# Altium footprint library My Library.PcbLib: 872 footprints (part 51 of 55)
Each footprint in its own frame and in the unit in brackets; x right, y up, seen from the top. Pads: shape width x height; smd on the part's side, far side on the other; paste and mask are expansions set on the pad; w line width, h text height; cw(c..) or ccw(c..) is an arc to the next point about the centre after c.
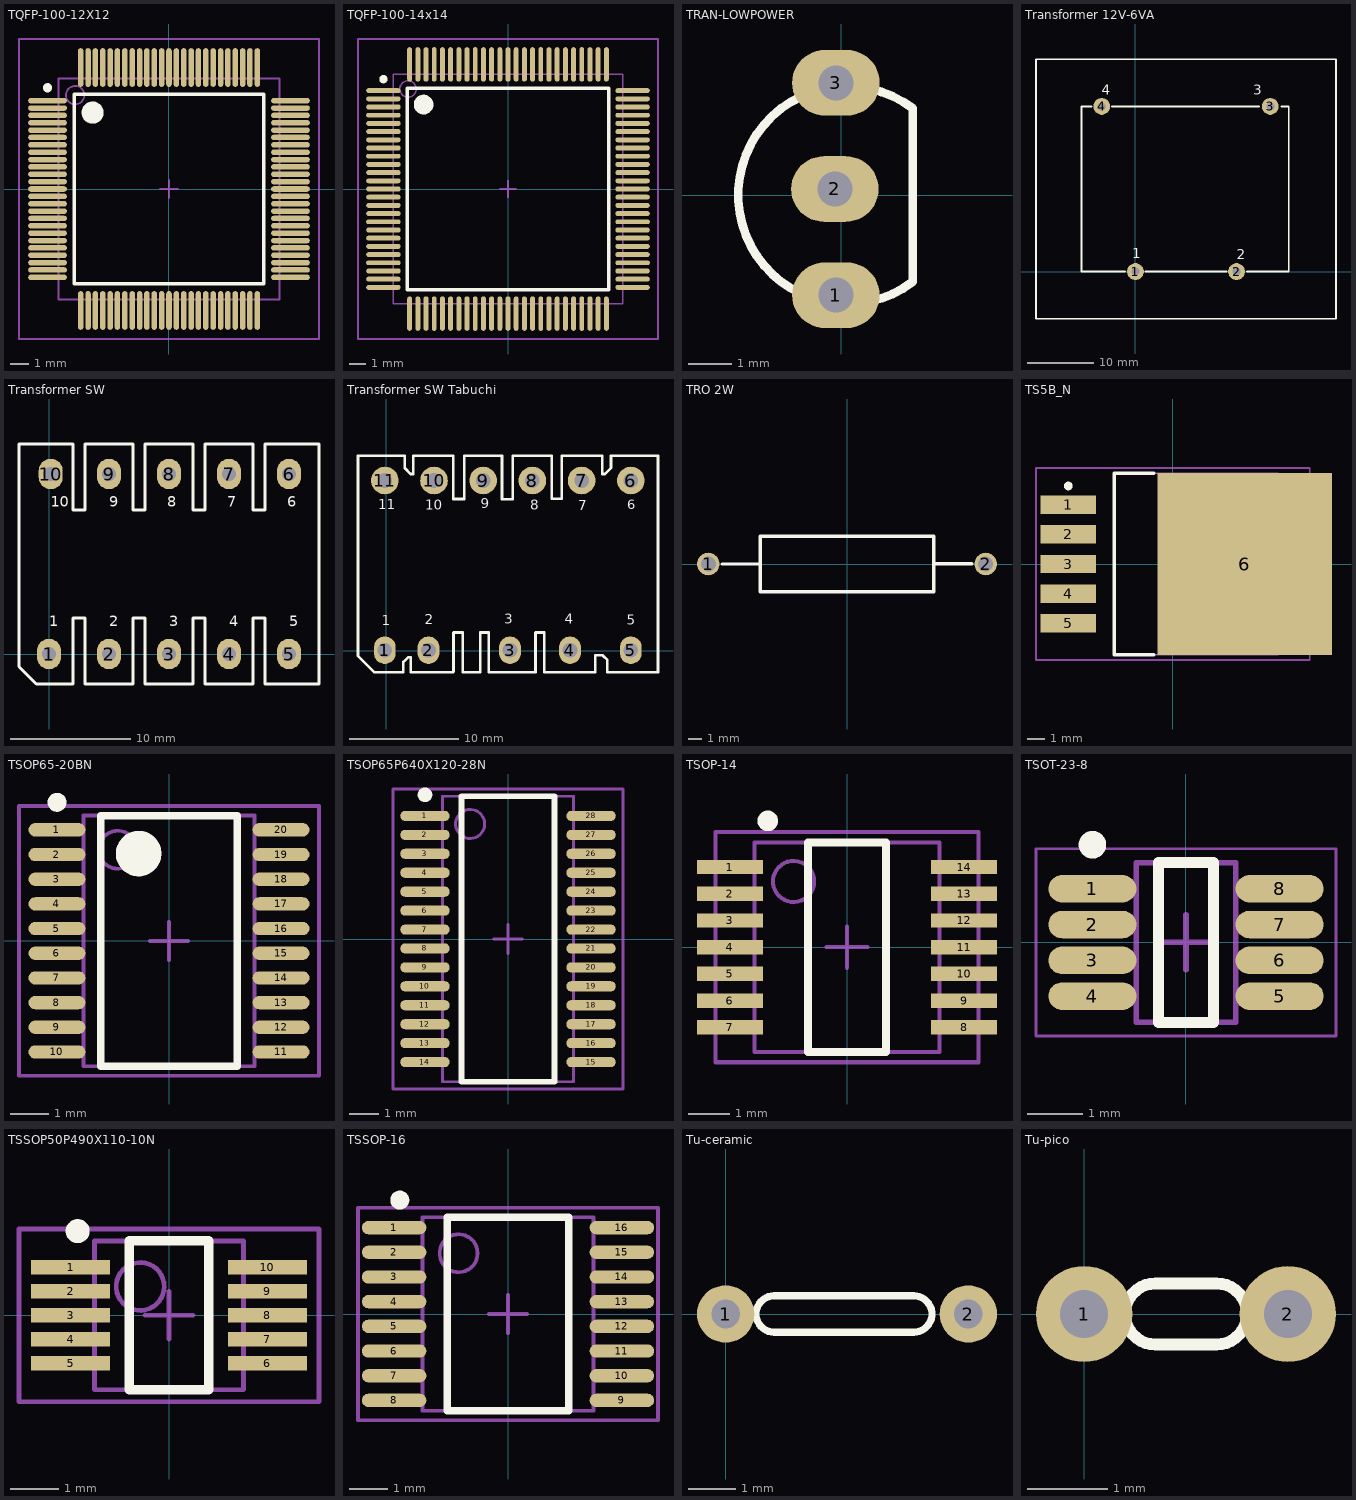
[diagram p50: the footprints below, top view; thin cyan lines are the x and y axes]

## TQFP-100-12X12 [mm] "Shrink QFP, 100-Leads, Body 12x12mm, Pitch 0.4mm, IPC High Density"
height 2.2
pads (100):
  oval 2.1x0.3 smd: 1(-6.6,4.8) 2(-6.6,4.4) 3(-6.6,4) 4(-6.6,3.6) 5(-6.6,3.2) 6(-6.6,2.8) 7(-6.6,2.4) 8(-6.6,2) 9(-6.6,1.6) 10(-6.6,1.2) 11(-6.6,0.8) 12(-6.6,0.4) 13(-6.6,0) 14(-6.6,-0.4) 15(-6.6,-0.8) 16(-6.6,-1.2) 17(-6.6,-1.6) 18(-6.6,-2) 19(-6.6,-2.4) 20(-6.6,-2.8) 21(-6.6,-3.2) 22(-6.6,-3.6) 23(-6.6,-4) 24(-6.6,-4.4) 25(-6.6,-4.8) 51(6.6,-4.8) 52(6.6,-4.4) 53(6.6,-4) 54(6.6,-3.6) 55(6.6,-3.2) 56(6.6,-2.8) 57(6.6,-2.4) 58(6.6,-2) 59(6.6,-1.6) 60(6.6,-1.2) 61(6.6,-0.8) 62(6.6,-0.4) 63(6.6,0) 64(6.6,0.4) 65(6.6,0.8) 66(6.6,1.2) 67(6.6,1.6) 68(6.6,2) 69(6.6,2.4) 70(6.6,2.8) 71(6.6,3.2) 72(6.6,3.6) 73(6.6,4) 74(6.6,4.4) 75(6.6,4.8)
  oval 0.3x2.1 smd: 26(-4.8,-6.6) 27(-4.4,-6.6) 28(-4,-6.6) 29(-3.6,-6.6) 30(-3.2,-6.6) 31(-2.8,-6.6) 32(-2.4,-6.6) 33(-2,-6.6) 34(-1.6,-6.6) 35(-1.2,-6.6) 36(-0.8,-6.6) 37(-0.4,-6.6) 38(0,-6.6) 39(0.4,-6.6) 40(0.8,-6.6) 41(1.2,-6.6) 42(1.6,-6.6) 43(2,-6.6) 44(2.4,-6.6) 45(2.8,-6.6) 46(3.2,-6.6) 47(3.6,-6.6) 48(4,-6.6) 49(4.4,-6.6) 50(4.8,-6.6) 76(4.8,6.6) 77(4.4,6.6) 78(4,6.6) 79(3.6,6.6) 80(3.2,6.6) 81(2.8,6.6) 82(2.4,6.6) 83(2,6.6) 84(1.6,6.6) 85(1.2,6.6) 86(0.8,6.6) 87(0.4,6.6) 88(0,6.6) 89(-0.4,6.6) 90(-0.8,6.6) 91(-1.2,6.6) 92(-1.6,6.6) 93(-2,6.6) 94(-2.4,6.6) 95(-2.8,6.6) 96(-3.2,6.6) 97(-3.6,6.6) 98(-4,6.6) 99(-4.4,6.6) 100(-4.8,6.6)
Top Overlay:
  circle w0.6: c-4.15,4.15 r0.3
  circle w0.25: c-6.6,5.5 r0.125
  lines w0.2: -5.15,-5.15 5.15,-5.15 5.15,5.15 -5.15,5.15 -5.15,-5.15
Mechanical 13:
  circle w0.1: c-5.1,5.1 r0.5
  lines w0.1: -6,-6 6,-6 6,6 -6,6 -6,-6
Mechanical 15:
  lines w0.1: -0.5,0 0.5,0 ; 0,-0.5 0,0.5 ; -8.15,-8.15 8.15,-8.15 8.15,8.15 -8.15,8.15 -8.15,-8.15
3D body: height 2.2, standoff 0, extent -6,-6 6,6

## TQFP-100-14x14 [mm] "Thin QFP, 100-Leads, Body 14x14mm, Pitch 0.5mm, IPC Low Density"
height 1.6
pads (100):
  oval 2.1x0.3 smd: 1(-7.6,6) 2(-7.6,5.5) 3(-7.6,5) 4(-7.6,4.5) 5(-7.6,4) 6(-7.6,3.5) 7(-7.6,3) 8(-7.6,2.5) 9(-7.6,2) 10(-7.6,1.5) 11(-7.6,1) 12(-7.6,0.5) 13(-7.6,0) 14(-7.6,-0.5) 15(-7.6,-1) 16(-7.6,-1.5) 17(-7.6,-2) 18(-7.6,-2.5) 19(-7.6,-3) 20(-7.6,-3.5) 21(-7.6,-4) 22(-7.6,-4.5) 23(-7.6,-5) 24(-7.6,-5.5) 25(-7.6,-6) 51(7.6,-6) 52(7.6,-5.5) 53(7.6,-5) 54(7.6,-4.5) 55(7.6,-4) 56(7.6,-3.5) 57(7.6,-3) 58(7.6,-2.5) 59(7.6,-2) 60(7.6,-1.5) 61(7.6,-1) 62(7.6,-0.5) 63(7.6,0) 64(7.6,0.5) 65(7.6,1) 66(7.6,1.5) 67(7.6,2) 68(7.6,2.5) 69(7.6,3) 70(7.6,3.5) 71(7.6,4) 72(7.6,4.5) 73(7.6,5) 74(7.6,5.5) 75(7.6,6)
  oval 0.3x2.1 smd: 26(-6,-7.6) 27(-5.5,-7.6) 28(-5,-7.6) 29(-4.5,-7.6) 30(-4,-7.6) 31(-3.5,-7.6) 32(-3,-7.6) 33(-2.5,-7.6) 34(-2,-7.6) 35(-1.5,-7.6) 36(-1,-7.6) 37(-0.5,-7.6) 38(0,-7.6) 39(0.5,-7.6) 40(1,-7.6) 41(1.5,-7.6) 42(2,-7.6) 43(2.5,-7.6) 44(3,-7.6) 45(3.5,-7.6) 46(4,-7.6) 47(4.5,-7.6) 48(5,-7.6) 49(5.5,-7.6) 50(6,-7.6) 76(6,7.6) 77(5.5,7.6) 78(5,7.6) 79(4.5,7.6) 80(4,7.6) 81(3.5,7.6) 82(3,7.6) 83(2.5,7.6) 84(2,7.6) 85(1.5,7.6) 86(1,7.6) 87(0.5,7.6) 88(0,7.6) 89(-0.5,7.6) 90(-1,7.6) 91(-1.5,7.6) 92(-2,7.6) 93(-2.5,7.6) 94(-3,7.6) 95(-3.5,7.6) 96(-4,7.6) 97(-4.5,7.6) 98(-5,7.6) 99(-5.5,7.6) 100(-6,7.6)
Top Overlay:
  circle w0.25: c-7.6,6.7 r0.125
  circle w0.6: c-5.15,5.15 r0.3
  lines w0.2: -6.15,-6.15 -6.15,6.15 6.15,6.15 6.15,-6.15 -6.15,-6.15
Mechanical 13:
  circle w0.1: c-6.1,6.1 r0.5
  lines w0.1: -7,-7 -7,7 7,7 7,-7 -7,-7
Mechanical 15:
  lines w0.1: -0.5,0 0.5,0 ; 0,-0.5 0,0.5 ; -9.15,-9.15 -9.15,9.15 9.15,9.15 9.15,-9.15 -9.15,-9.15
3D body: height 1.6, standoff 0, extent -7,-7 7,7

## TRAN-LOWPOWER [mm] "TO, Flat Index; 3 In-Line, Axial Leads; Body Dia. 4.5mm; Leads 0.51 x 0.48 mm (max)"
height 6.86
pads (3):
  oval 2x1.5 hole 0.8: 1(-0.127,-2.286) 2(-0.151,0.139) 3(-0.127,2.564)
Top Overlay:
  lines w0.2: 1.627,-1.98 cw(c0.127,0) 1.627,1.98 1.627,-1.98
3D body "BJT.step": height 11, standoff -1, extent -2.476,-2.794 1.524,3.006

## Transformer 12V-6VA [mm] "Transformer; 4 Leads"
pads (4):
  round 2.54 hole 1.2: 1(0,0) 2(15.24,0) 3(20.32,24.892) 4(-5.08,24.892)
Top Overlay:
  lines w0.254: -6.604,24.892 -8.128,24.892 -8.128,24.638 -8.128,0.254 -8.128,0 -1.524,0 ; -3.556,24.892 18.669,24.892 ; 1.524,0 13.716,0 ; 16.764,0 23.114,0 23.114,0.254 23.114,24.638 23.114,24.892 21.971,24.892 ; -14.986,-7.112 -14.986,32.004 30.226,32.004 30.226,-7.112 -14.986,-7.112
  text "3" at 17.78,26.67 h1.5
  text "4" at -5.08,26.67 h1.5
  text "2" at 15.24,1.882 h1.5
  text "1" at -0.508,2.032 h1.5
3D body: height 31, standoff 20, extent -8.128,0 23.114,24.892
3D body: height 26, standoff 1, extent -14.986,-7.112 30.226,32.004
3D body: height 1, standoff -4, extent -5.576,24.393 -4.58,25.391
3D body: height 1, standoff -4, extent 19.824,24.393 20.82,25.391
3D body: height 1, standoff -4, extent 14.744,-0.499 15.74,0.499
3D body: height 1, standoff -4, extent -0.496,-0.499 0.5,0.499

## Transformer SW [mm] "Transformer; 4 Leads"
pads (10):
  oval 2x2.54 hole 1.2: 1(0,0) 2(5,0) 3(10,0) 4(15,0) 5(20,0) 6(20,15) 7(15,15) 8(10,15) 9(5,15) 10(0.142,15)
Top Overlay:
  lines w0.254: -2.5,-1.056 -2.5,17.5 2,17.5 2,12 3,12 3,17.5 7,17.5 7,12 8,12 8,17.5 12,17.5 12,12 13,12 13,17.5 17,17.5 17,12 18,12 18,17.5 22.5,17.5 22.5,-2.5 18,-2.5 18,3 17,3 17,-2.5 13,-2.5 13,3 12,3 12,-2.5 8,-2.5 8,3 7,3 7,-2.5 3,-2.5 3,3 2,3 2,-2.5 -1.056,-2.5 -2.5,-1.056
  text "10" at 0.142,12 h1.52
  text "9" at 5,12 h1.52
  text "8" at 9.873,12 h1.52
  text "7" at 14.873,12 h1.52
  text "6" at 19.873,12 h1.52
  text "5" at 20,2 h1.52
  text "4" at 15,2 h1.52
  text "3" at 10,2.032 h1.52
  text "2" at 5,2.032 h1.52
  text "1" at 0,2.032 h1.5
3D body: height 1, standoff -4, extent -0.496,-0.499 0.5,0.499

## Transformer SW Tabuchi [mil] "Transformer; 4 Leads"
pads (11):
  oval 78.74x100 hole 53.15: 1(-5,1) 2(153,1) 3(448,1) 4(665,1) 5(885,1)
  round 100 hole 53.15: 6(885,615) 7(707,615) 8(529,615) 9(351,615) 10(173,615) 11(-5,615)
Top Overlay:
  lines w10: 89,-79 243,-79 ; 89,-77 89,-24 80,-24 62,-42 62,-79 -43,-79 -102,-20 -102,705 67,705 67,660 88,639 98,639 98,705 243,705 243,548 282,548 282,705 419,705 419,547 458,547 458,705 599,705 599,549 635,549 635,705 782,705 782,639 792,639 813,660 813,705 983.43,705 983.43,-79 800,-79 800,-34 783,-17 756,-17 756,-79 572,-79 572,65 540,65 540,-79 371,-79 371,65 340,65 340,-79 277,-79 277,65 244,65 244,-68.98 244,-76 243,-77
  text "11" at -28,498 h60
  text "5" at 871,80 h60
  text "4" at 646,84 h60
  text "3" at 428,85 h60
  text "2" at 140,82 h60
  text "1" at -16,78 h60
  text "10" at 141,497 h60
  text "9" at 343,502 h60
  text "8" at 521,496 h60
  text "7" at 694,494 h60
  text "6" at 873,499 h59.06
3D body: height 748.03, standoff 236.22, extent 80.5,-80 800.5,700
3D body: height 39.37, standoff -157.48, extent 687.31,595.36 726.53,634.64
3D body: height 39.37, standoff -157.48, extent 509.31,595.36 548.53,634.64
3D body: height 39.37, standoff -157.48, extent 331.31,595.36 370.53,634.64
3D body: height 39.37, standoff -157.48, extent 153.31,595.36 192.53,634.64
3D body: height 39.37, standoff -157.48, extent -24.69,595.36 14.53,634.64
3D body: height 39.37, standoff -157.48, extent -24.69,-18.64 14.53,20.64
3D body: height 39.37, standoff -157.48, extent 133.31,-18.64 172.53,20.64
3D body: height 39.37, standoff -157.48, extent 428.31,-18.64 467.53,20.64
3D body: height 39.37, standoff -157.48, extent 645.31,-18.64 684.53,20.64
3D body: height -748.03, standoff -826.77, extent -103,-80 984,705
3D body: height 39.37, standoff -157.48, extent 865.31,-18.64 904.53,20.64
3D body: height 39.37, standoff -157.48, extent 865.31,595.36 904.53,634.64
3D body: height -39.37, standoff -196.85, extent -103,-80 984,705
3D body: height 830.71, standoff 39.37, extent -110,230 990,420

## TRO 2W [mil] "Tro 2W"
height 10
pads (2):
  round 65 hole 43.31: 1(-400,0) 2(400,0)
Top Overlay:
  lines w10: -360,0 -250,0 ; 251,1 250,0 250,-80 -250,-80 -250,80 250,80 250,1 360,1
3D body "User Library-Res80 2W SilCoat.STEP": height 217.48, standoff -68.74, extent -415.95,-108.28 415.94,108.26

## TS5B_N [mm]
pads (6):
  rect 3.2x1.05 smd: 1(-6,3.4) 2(-6,1.7) 3(-6,0) 4(-6,-1.7) 5(-6,-3.4)
  rect 10x10.45 smd: 6(4.131,0)
Top Overlay:
  circle w0.25: c-6,4.475 r0.125
  lines w0.2: -1.1,-5.2 -3.35,-5.2 -3.35,5.2 -1.1,5.2
Mechanical 13:
  lines w0.1: -3.35,-5.2 6.05,-5.2 6.05,5.2 -3.35,5.2 -3.35,-5.2
Mechanical 15:
  lines w0.1: -0.5,0 0.5,0 ; 0,-0.5 0,0.5 ; -7.85,-5.5 7.85,-5.5 7.85,5.5 -7.85,5.5 -7.85,-5.5
3D body: height 4.65, standoff 0, extent -3.35,-5.2 6.05,5.2
3D body: height 0.5, standoff 0, extent -6.566,2.832 -4.305,3.924
3D body: height 2, standoff 0, extent -4.953,2.832 -4.293,3.924
3D body: height 2, standoff 1.5, extent -4.953,2.845 -3.251,3.937
3D body: height 2, standoff 1.5, extent -4.966,1.156 -3.264,2.248
3D body: height 2, standoff 0, extent -4.966,1.143 -4.305,2.235
3D body: height 0.5, standoff 0, extent -6.579,1.143 -4.318,2.235
3D body: height 0.5, standoff 0, extent -6.553,-2.286 -4.293,-1.194
3D body: height 2, standoff 0, extent -4.94,-2.286 -4.28,-1.194
3D body: height 2, standoff 1.5, extent -4.94,-2.273 -3.238,-1.181
3D body: height 2, standoff 1.5, extent -4.928,-0.584 -3.226,0.508
3D body: height 2, standoff 0, extent -4.928,-0.597 -4.267,0.495
3D body: height 0.5, standoff 0, extent -6.54,-0.597 -4.28,0.495
3D body: height 2, standoff 1.5, extent -4.953,-3.937 -3.251,-2.845
3D body: height 2, standoff 0, extent -4.953,-3.95 -4.293,-2.857
3D body: height 0.5, standoff 0, extent -6.566,-3.95 -4.305,-2.857

## TSOP65-20BN [mm] "TSOP, 20-Leads, Body 6.5x4.4mm, Pitch 0.65mm, IPC Medium Density"
height 1.2
pads (20):
  oval 1.5x0.35 smd: 1(-2.95,2.925) 2(-2.95,2.275) 3(-2.95,1.625) 4(-2.95,0.975) 5(-2.95,0.325) 6(-2.95,-0.325) 7(-2.95,-0.975) 8(-2.95,-1.625) 9(-2.95,-2.275) 10(-2.95,-2.925) 11(2.95,-2.925) 12(2.95,-2.275) 13(2.95,-1.625) 14(2.95,-0.975) 15(2.95,-0.325) 16(2.95,0.325) 17(2.95,0.975) 18(2.95,1.625) 19(2.95,2.275) 20(2.95,2.925)
Top Overlay:
  circle w0.25: c-2.95,3.65 r0.125
  circle w0.6: c-0.8,2.3 r0.3
  lines w0.2: -1.8,-3.3 -1.8,3.3 1.8,3.3 1.8,-3.3 -1.8,-3.3
Mechanical 13:
  circle w0.1: c-1.35,2.4 r0.5
  lines w0.1: -2.25,-3.3 -2.25,3.3 2.25,3.3 2.25,-3.3 -2.25,-3.3
Mechanical 15:
  lines w0.1: -0.5,0 0.5,0 ; 0,-0.5 0,0.5 ; -3.95,-3.55 -3.95,3.55 3.95,3.55 3.95,-3.55 -3.95,-3.55
3D body: height 1.2, standoff 0, extent -2.25,-3.3 2.25,3.3

## TSOP65P640X120-28N [mm] "TSOP, 28-Leads, Body 9,8x4,5mm (max), Pitch 0,65mm, IPC Medium Density"
height 1.2
pads (28):
  oval 1.7x0.35 smd: 1(-2.85,4.225) 2(-2.85,3.575) 3(-2.85,2.925) 4(-2.85,2.275) 5(-2.85,1.625) 6(-2.85,0.975) 7(-2.85,0.325) 8(-2.85,-0.325) 9(-2.85,-0.975) 10(-2.85,-1.625) 11(-2.85,-2.275) 12(-2.85,-2.925) 13(-2.85,-3.575) 14(-2.85,-4.225) 15(2.85,-4.225) 16(2.85,-3.575) 17(2.85,-2.925) 18(2.85,-2.275) 19(2.85,-1.625) 20(2.85,-0.975) 21(2.85,-0.325) 22(2.85,0.325) 23(2.85,0.975) 24(2.85,1.625) 25(2.85,2.275) 26(2.85,2.925) 27(2.85,3.575) 28(2.85,4.225)
Top Overlay:
  circle w0.25: c-2.85,4.95 r0.125
  lines w0.2: -1.6,-4.9 1.6,-4.9 1.6,4.9 -1.6,4.9 -1.6,-4.9
Mechanical 13:
  circle w0.1: c-1.3,3.95 r0.5
  lines w0.1: -2.25,-4.9 2.25,-4.9 2.25,4.9 -2.25,4.9 -2.25,-4.9
Mechanical 15:
  lines w0.1: -0.5,0 0.5,0 ; 0,-0.5 0,0.5 ; -3.95,-5.15 3.95,-5.15 3.95,5.15 -3.95,5.15 -3.95,-5.15
3D body: height 1.2, standoff 0.1, extent -2.25,-4.9 2.25,4.9
3D body: height 0.3, standoff 0.1, extent -3.453,-4.39 -2.767,-4.06
3D body: height 0.7, standoff 0.5, extent -2.932,-4.39 -2.247,-4.06
3D body: height 0.7, standoff 0.1, extent -2.932,-4.39 -2.767,-4.06
3D body: height 0.3, standoff 0.1, extent -3.453,-3.74 -2.767,-3.41
3D body: height 0.7, standoff 0.5, extent -2.932,-3.74 -2.247,-3.41
3D body: height 0.7, standoff 0.1, extent -2.932,-3.74 -2.767,-3.41
3D body: height 0.7, standoff 0.1, extent 2.767,-4.39 2.932,-4.06
3D body: height 0.7, standoff 0.5, extent 2.247,-4.39 2.932,-4.06
3D body: height 0.3, standoff 0.1, extent 2.767,-4.39 3.453,-4.06
3D body: height 0.7, standoff 0.1, extent 2.767,-3.74 2.932,-3.41
3D body: height 0.7, standoff 0.5, extent 2.247,-3.74 2.932,-3.41
3D body: height 0.3, standoff 0.1, extent 2.767,-3.74 3.453,-3.41
3D body: height 0.3, standoff 0.1, extent 2.718,-3.094 3.404,-2.764
3D body: height 0.7, standoff 0.5, extent 2.197,-3.094 2.883,-2.764
3D body: height 0.7, standoff 0.1, extent 2.718,-3.094 2.883,-2.764
3D body: height 0.7, standoff 0.1, extent 2.767,-2.44 2.932,-2.11
3D body: height 0.7, standoff 0.5, extent 2.247,-2.44 2.932,-2.11
3D body: height 0.3, standoff 0.1, extent 2.767,-2.44 3.453,-2.11
3D body: height 0.7, standoff 0.1, extent 2.767,-1.79 2.932,-1.46
3D body: height 0.7, standoff 0.5, extent 2.247,-1.79 2.932,-1.46
3D body: height 0.3, standoff 0.1, extent 2.767,-1.79 3.453,-1.46
3D body: height 0.7, standoff 0.1, extent 2.767,-1.14 2.932,-0.81
3D body: height 0.7, standoff 0.5, extent 2.247,-1.14 2.932,-0.81
3D body: height 0.3, standoff 0.1, extent 2.767,-1.14 3.453,-0.81
3D body: height 0.3, standoff 0.1, extent 2.718,-0.494 3.404,-0.164
3D body: height 0.7, standoff 0.5, extent 2.197,-0.494 2.883,-0.164
3D body: height 0.7, standoff 0.1, extent 2.718,-0.494 2.883,-0.164
3D body: height 0.7, standoff 0.1, extent 2.767,0.16 2.932,0.49
3D body: height 0.7, standoff 0.5, extent 2.247,0.16 2.932,0.49
3D body: height 0.3, standoff 0.1, extent 2.767,0.16 3.453,0.49
3D body: height 0.7, standoff 0.1, extent 2.767,0.81 2.932,1.14
3D body: height 0.7, standoff 0.5, extent 2.247,0.81 2.932,1.14
3D body: height 0.3, standoff 0.1, extent 2.767,0.81 3.453,1.14
3D body: height 0.7, standoff 0.1, extent 2.767,1.46 2.932,1.79
3D body: height 0.7, standoff 0.5, extent 2.247,1.46 2.932,1.79
3D body: height 0.3, standoff 0.1, extent 2.767,1.46 3.453,1.79
3D body: height 0.3, standoff 0.1, extent 2.718,2.106 3.404,2.436
3D body: height 0.7, standoff 0.5, extent 2.197,2.106 2.883,2.436
3D body: height 0.7, standoff 0.1, extent 2.718,2.106 2.883,2.436
3D body: height 0.7, standoff 0.1, extent 2.767,2.76 2.932,3.09
3D body: height 0.7, standoff 0.5, extent 2.247,2.76 2.932,3.09
3D body: height 0.3, standoff 0.1, extent 2.767,2.76 3.453,3.09
3D body: height 0.7, standoff 0.1, extent 2.767,3.41 2.932,3.74
3D body: height 0.7, standoff 0.5, extent 2.247,3.41 2.932,3.74
3D body: height 0.3, standoff 0.1, extent 2.767,3.41 3.453,3.74
3D body: height 0.7, standoff 0.1, extent 2.767,4.06 2.932,4.39
3D body: height 0.7, standoff 0.5, extent 2.247,4.06 2.932,4.39
3D body: height 0.3, standoff 0.1, extent 2.767,4.06 3.453,4.39
3D body: height 0.3, standoff 0.1, extent -3.404,-1.136 -2.718,-0.806
3D body: height 0.7, standoff 0.5, extent -2.883,-1.136 -2.197,-0.806
3D body: height 0.7, standoff 0.1, extent -2.883,-1.136 -2.718,-0.806
3D body: height 0.7, standoff 0.1, extent -2.932,-1.79 -2.767,-1.46
3D body: height 0.7, standoff 0.5, extent -2.932,-1.79 -2.247,-1.46
3D body: height 0.3, standoff 0.1, extent -3.453,-1.79 -2.767,-1.46
3D body: height 0.7, standoff 0.1, extent -2.932,-2.44 -2.767,-2.11
3D body: height 0.7, standoff 0.5, extent -2.932,-2.44 -2.247,-2.11
3D body: height 0.3, standoff 0.1, extent -3.453,-2.44 -2.767,-2.11
3D body: height 0.7, standoff 0.1, extent -2.932,-3.09 -2.767,-2.76
3D body: height 0.7, standoff 0.5, extent -2.932,-3.09 -2.247,-2.76
3D body: height 0.3, standoff 0.1, extent -3.453,-3.09 -2.767,-2.76
3D body: height 0.3, standoff 0.1, extent -3.404,1.464 -2.718,1.794
3D body: height 0.7, standoff 0.5, extent -2.883,1.464 -2.197,1.794
3D body: height 0.7, standoff 0.1, extent -2.883,1.464 -2.718,1.794
3D body: height 0.7, standoff 0.1, extent -2.932,0.81 -2.767,1.14
3D body: height 0.7, standoff 0.5, extent -2.932,0.81 -2.247,1.14
3D body: height 0.3, standoff 0.1, extent -3.453,0.81 -2.767,1.14
3D body: height 0.7, standoff 0.1, extent -2.932,0.16 -2.767,0.49
3D body: height 0.7, standoff 0.5, extent -2.932,0.16 -2.247,0.49
3D body: height 0.3, standoff 0.1, extent -3.453,0.16 -2.767,0.49
3D body: height 0.7, standoff 0.1, extent -2.932,-0.49 -2.767,-0.16
3D body: height 0.7, standoff 0.5, extent -2.932,-0.49 -2.247,-0.16
3D body: height 0.3, standoff 0.1, extent -3.453,-0.49 -2.767,-0.16
3D body: height 0.3, standoff 0.1, extent -3.453,2.11 -2.767,2.44
3D body: height 0.7, standoff 0.5, extent -2.932,2.11 -2.247,2.44
3D body: height 0.7, standoff 0.1, extent -2.932,2.11 -2.767,2.44
3D body: height 0.3, standoff 0.1, extent -3.453,2.76 -2.767,3.09
3D body: height 0.7, standoff 0.5, extent -2.932,2.76 -2.247,3.09
3D body: height 0.7, standoff 0.1, extent -2.932,2.76 -2.767,3.09
3D body: height 0.3, standoff 0.1, extent -3.453,3.41 -2.767,3.74
3D body: height 0.7, standoff 0.5, extent -2.932,3.41 -2.247,3.74
3D body: height 0.7, standoff 0.1, extent -2.932,3.41 -2.767,3.74
3D body: height 0.7, standoff 0.1, extent -2.883,4.064 -2.718,4.394
3D body: height 0.7, standoff 0.5, extent -2.883,4.064 -2.197,4.394
3D body: height 0.3, standoff 0.1, extent -3.404,4.064 -2.718,4.394

## TSOP-14 [mm] "TSOP, 14-Leads, Body 5,1x4,5mm (max), Pitch 0,65mm, IPC Medium Density"
height 1.2
pads (14):
  rect 1.6x0.35 smd: 1(-2.85,1.95) 2(-2.85,1.3) 3(-2.85,0.65) 4(-2.85,0) 5(-2.85,-0.65) 6(-2.85,-1.3) 7(-2.85,-1.95) 8(2.85,-1.95) 9(2.85,-1.3) 10(2.85,-0.65) 11(2.85,0) 12(2.85,0.65) 13(2.85,1.3) 14(2.85,1.95)
Top Overlay:
  circle w0.25: c-1.928,3.073 r0.125
  lines w0.2: -0.95,-2.55 0.95,-2.55 0.95,2.55 -0.95,2.55 -0.95,-2.55
Mechanical 13:
  circle w0.1: c-1.3,1.6 r0.5
  lines w0.1: -2.25,-2.55 2.25,-2.55 2.25,2.55 -2.25,2.55 -2.25,-2.55
Mechanical 15:
  lines w0.1: -0.5,0 0.5,0 ; 0,-0.5 0,0.5 ; -3.2,-2.8 3.2,-2.8 3.2,2.8 -3.2,2.8 -3.2,-2.8
3D body: height 1.2, standoff 0.1, extent -2.25,-2.55 2.25,2.55

## TSOT-23-8 [mm] "TSOT-23, 8-Leads, Body 2,90x1,63mm, Pitch 0,65mm, IPC Medium Density"
height 1
pads (8):
  oval 1.6x0.5 smd: 1(-1.7,0.975) 2(-1.7,0.325) 3(-1.7,-0.325) 4(-1.7,-0.975) 5(1.7,-0.975) 6(1.7,-0.325) 7(1.7,0.325) 8(1.7,0.975)
Top Overlay:
  circle w0.25: c-1.7,1.775 r0.125
  lines w0.2: -0.5,-1.45 0.5,-1.45 0.5,1.45 -0.5,1.45 -0.5,-1.45
Mechanical 13:
  lines w0.1: -0.9,-1.45 0.9,-1.45 0.9,1.45 -0.9,1.45 -0.9,-1.45
Mechanical 15:
  lines w0.05: -2.725,-1.7 2.725,-1.7 2.725,1.7 -2.725,1.7 -2.725,-1.7
  lines w0.1: -0.5,0 0.5,0 ; 0,-0.5 0,0.5
3D body "TSOT-23-8.step": height 1, standoff 0, extent -1.4,-1.45 1.4,1.45

## TSSOP50P490X110-10N [mm] "TSSOP, 10-Leads, Body 3,1x3,1mm (max), Pitch 0,50mm, IPC Medium Density"
height 1.1
pads (10):
  rect 1.65x0.3 smd: 1(-2.05,1) 2(-2.05,0.5) 3(-2.05,0) 4(-2.05,-0.5) 5(-2.05,-1) 6(2.05,-1) 7(2.05,-0.5) 8(2.05,0) 9(2.05,0.5) 10(2.05,1)
Top Overlay:
  circle w0.25: c-1.903,1.753 r0.125
  lines w0.2: -0.825,-1.55 0.825,-1.55 0.825,1.55 -0.825,1.55 -0.825,-1.55
Mechanical 13:
  circle w0.1: c-0.6,0.6 r0.5
  lines w0.1: -1.55,-1.55 1.55,-1.55 1.55,1.55 -1.55,1.55 -1.55,-1.55
Mechanical 15:
  lines w0.1: -0.5,0 0.5,0 ; 0,-0.5 0,0.5 ; -3.125,-1.8 3.125,-1.8 3.125,1.8 -3.125,1.8 -3.125,-1.8
3D body: height 1.1, standoff 0.1, extent -1.55,-1.55 1.55,1.55

## TSSOP-16 [mm]
height 1.2
pads (16):
  oval 1.7x0.35 smd: 1(-3,2.275) 2(-3,1.625) 3(-3,0.975) 4(-3,0.325) 5(-3,-0.325) 6(-3,-0.975) 7(-3,-1.625) 8(-3,-2.275) 9(3,-2.275) 10(3,-1.625) 11(3,-0.975) 12(3,-0.325) 13(3,0.325) 14(3,0.975) 15(3,1.625) 16(3,2.275)
Top Overlay:
  circle w0.25: c-2.85,3 r0.125
  lines w0.2: -1.6,-2.55 1.6,-2.55 1.6,2.55 -1.6,2.55 -1.6,-2.55
Mechanical 13:
  circle w0.1: c-1.3,1.6 r0.5
  lines w0.1: -2.25,-2.55 2.25,-2.55 2.25,2.55 -2.25,2.55 -2.25,-2.55
Mechanical 15:
  lines w0.1: -0.5,0 0.5,0 ; 0,-0.5 0,0.5 ; -3.95,-2.8 3.95,-2.8 3.95,2.8 -3.95,2.8 -3.95,-2.8
3D body: height 1.21, standoff 0, extent -1.88,1.756 -1.481,2.155
3D body: height 0.6, standoff 0.45, extent 2.25,-1.791 2.936,-1.46
3D body: height 0.6, standoff 0, extent 2.783,-1.791 2.936,-1.46
3D body: height 0.15, standoff 0, extent 2.783,-1.791 3.469,-1.46
3D body: height 0.6, standoff 0.45, extent 2.25,-2.451 2.936,-2.121
3D body: height 0.6, standoff 0, extent 2.783,-2.451 2.936,-2.121
3D body: height 0.15, standoff 0, extent 2.783,-2.451 3.469,-2.121
3D body: height 0.15, standoff 0, extent 2.783,-1.13 3.469,-0.8
3D body: height 0.6, standoff 0, extent 2.783,-1.13 2.936,-0.8
3D body: height 0.6, standoff 0.45, extent 2.25,-1.13 2.936,-0.8
3D body: height 0.15, standoff 0, extent 2.783,-0.47 3.469,-0.14
3D body: height 0.6, standoff 0, extent 2.783,-0.47 2.936,-0.14
3D body: height 0.6, standoff 0.45, extent 2.25,-0.47 2.936,-0.14
3D body: height 0.15, standoff 0, extent 2.783,0.165 3.469,0.495
3D body: height 0.6, standoff 0, extent 2.783,0.165 2.936,0.495
3D body: height 0.6, standoff 0.45, extent 2.25,0.165 2.936,0.495
3D body: height 0.15, standoff 0, extent 2.783,0.826 3.469,1.156
3D body: height 0.6, standoff 0, extent 2.783,0.826 2.936,1.156
3D body: height 0.6, standoff 0.45, extent 2.25,0.826 2.936,1.156
3D body: height 0.15, standoff 0, extent 2.783,1.46 3.469,1.791
3D body: height 0.6, standoff 0, extent 2.783,1.46 2.936,1.791
3D body: height 0.6, standoff 0.45, extent 2.25,1.46 2.936,1.791
3D body: height 0.15, standoff 0, extent 2.783,2.121 3.469,2.451
3D body: height 0.6, standoff 0, extent 2.783,2.121 2.936,2.451
3D body: height 0.6, standoff 0.45, extent 2.25,2.121 2.936,2.451
3D body: height 0.6, standoff 0.45, extent -2.936,-2.451 -2.25,-2.121
3D body: height 0.6, standoff 0, extent -2.936,-2.451 -2.783,-2.121
3D body: height 0.15, standoff 0, extent -3.469,-2.451 -2.783,-2.121
3D body: height 0.6, standoff 0.45, extent -2.936,-1.791 -2.25,-1.46
3D body: height 0.6, standoff 0, extent -2.936,-1.791 -2.783,-1.46
3D body: height 0.15, standoff 0, extent -3.469,-1.791 -2.783,-1.46
3D body: height 0.6, standoff 0.45, extent -2.936,-1.156 -2.25,-0.826
3D body: height 0.6, standoff 0, extent -2.936,-1.156 -2.783,-0.826
3D body: height 0.15, standoff 0, extent -3.469,-1.156 -2.783,-0.826
3D body: height 0.6, standoff 0.45, extent -2.936,-0.495 -2.25,-0.165
3D body: height 0.6, standoff 0, extent -2.936,-0.495 -2.783,-0.165
3D body: height 0.15, standoff 0, extent -3.469,-0.495 -2.783,-0.165
3D body: height 0.6, standoff 0.45, extent -2.936,0.14 -2.25,0.47
3D body: height 0.6, standoff 0, extent -2.936,0.14 -2.783,0.47
3D body: height 0.15, standoff 0, extent -3.469,0.14 -2.783,0.47
3D body: height 0.6, standoff 0.45, extent -2.936,0.8 -2.25,1.13
3D body: height 0.6, standoff 0, extent -2.936,0.8 -2.783,1.13
3D body: height 0.15, standoff 0, extent -3.469,0.8 -2.783,1.13
3D body: height 0.15, standoff 0, extent -3.469,2.121 -2.783,2.451
3D body: height 0.6, standoff 0, extent -2.936,2.121 -2.783,2.451
3D body: height 0.6, standoff 0.45, extent -2.936,2.121 -2.25,2.451
3D body: height 0.15, standoff 0, extent -3.469,1.46 -2.783,1.791
3D body: height 0.6, standoff 0, extent -2.936,1.46 -2.783,1.791
3D body: height 0.6, standoff 0.45, extent -2.936,1.46 -2.25,1.791
3D body: height 1.2, standoff 0, extent -2.25,-2.55 2.25,2.55

## Tu-ceramic [mm] "Tu gom mini"
pads (2):
  round 1.2 hole 0.6: 1(0,0) 2(5.08,0)
Top Overlay:
  lines w0.15: 1.016,-0.381 cw(c1.016,0) 1.016,0.381 3.937,0.381 cw(c3.937,0) 3.937,-0.381 1.016,-0.381
3D body "User Library-Cap 100n.step": height 6.12, standoff -1.8, extent -0.378,-0.848 5.461,0.848

## Tu-pico [mm] "Tu gom mini"
pads (2):
  round 1.2 hole 0.6: 1(0,0) 2(2.54,0)
Top Overlay:
  lines w0.15: 0.889,-0.381 cw(c0.889,0) 0.889,0.381 1.651,0.381 cw(c1.651,0) 1.651,-0.381 0.889,-0.381
3D body "User Library-Cap 100n.step": height 6.12, standoff -1.8, extent -1.647,-0.848 4.191,0.848